# Altium footprint library IC.PCBLIB: 359 footprints (part 22 of 23)
Each footprint in its own frame and in the unit in brackets; x right, y up, seen from the top. Pads: shape width x height; smd on the part's side, far side on the other; paste and mask are expansions set on the pad; w line width, h text height; cw(c..) or ccw(c..) is an arc to the next point about the centre after c.
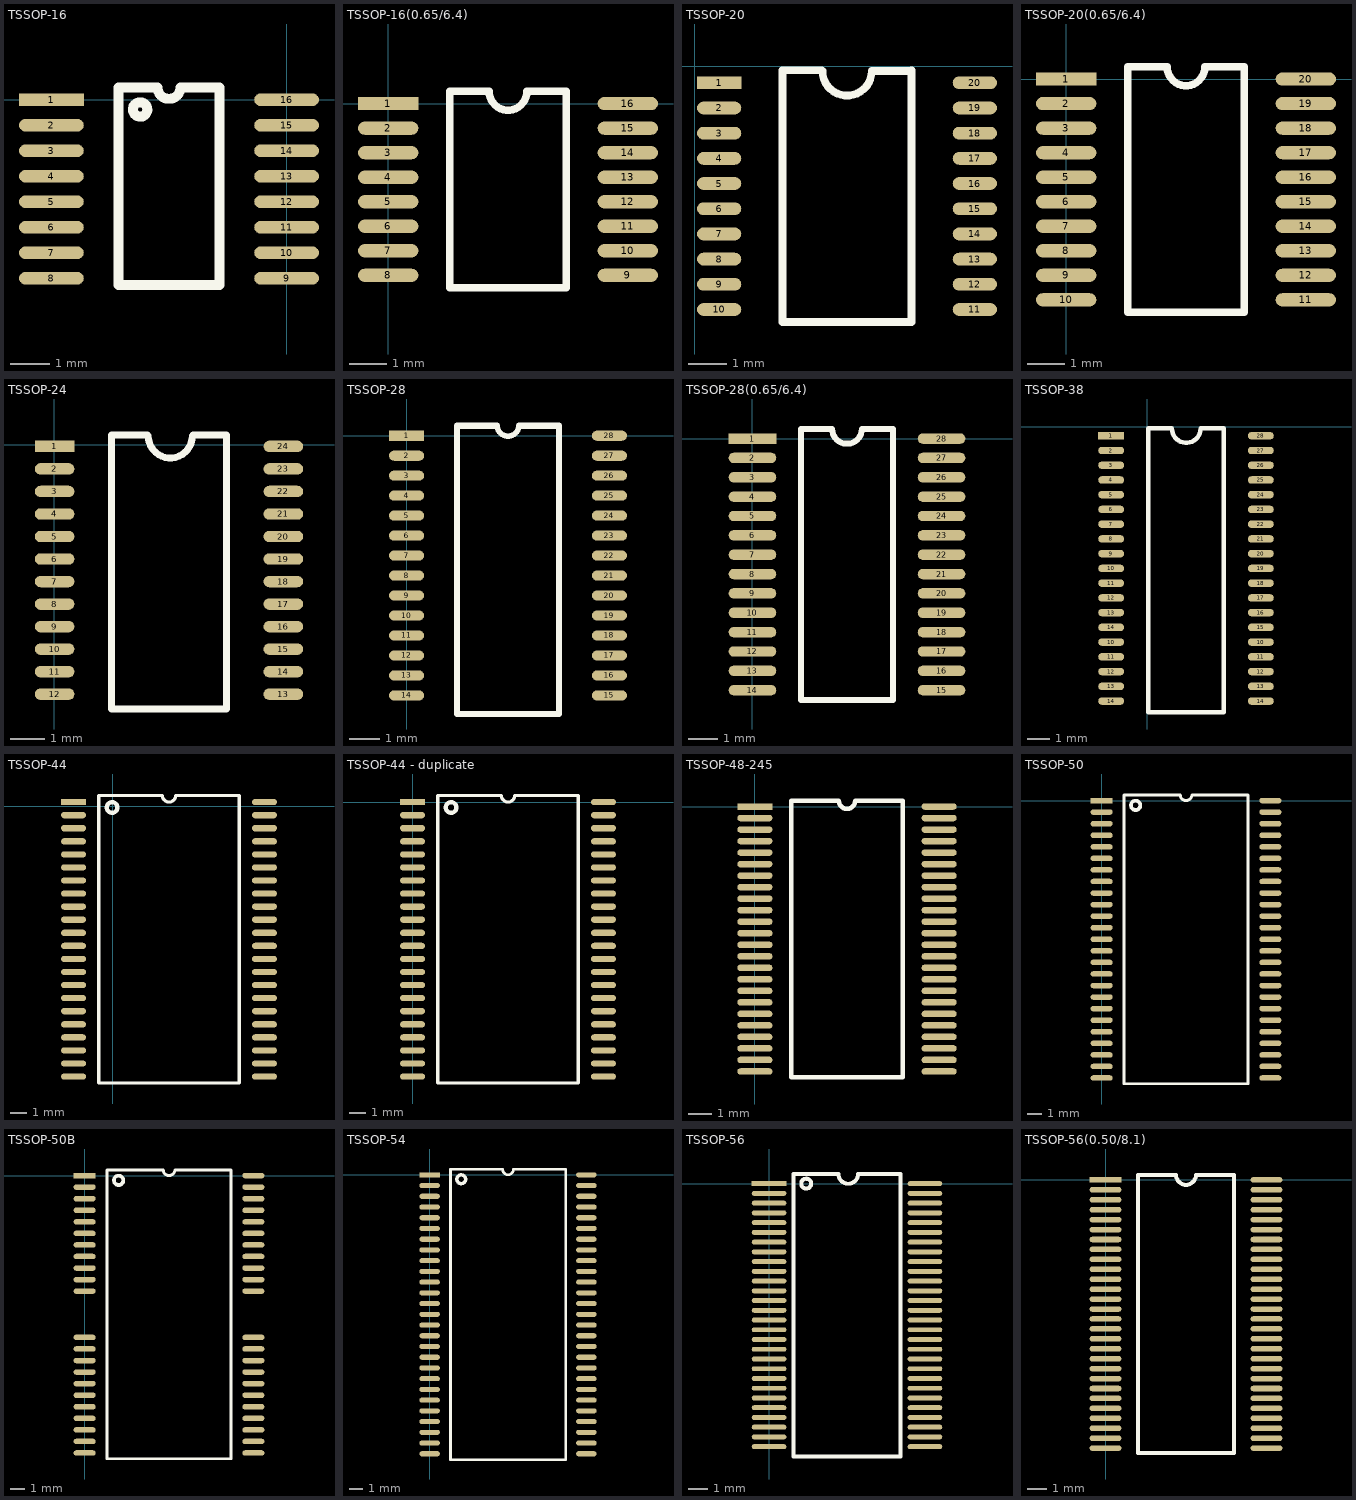
[diagram p21: the footprints below, top view; thin cyan lines are the x and y axes]

## TSSOP-16 [mil]
pads (16):
  rect 65x12.5 smd: 1(-236,0)
  oval 65x12.5 smd: 2(-236,-25.59) 3(-236,-51.18) 4(-236,-76.77) 5(-236,-102.36) 6(-236,-127.95) 7(-236,-153.54) 8(-236,-179.13) 9(0,-179.13) 10(0,-153.54) 11(0,-127.95) 12(0,-102.36) 13(0,-76.77) 14(0,-51.18) 15(0,-25.59) 16(0,0)
TopOverlay:
  lines w10: -147,-17 cw(c-147,-9.79) -145.98,-16.93 ; -168.5,-186 -67.5,-186 -67.5,12.5 -106.46,12.5 cw(c-118,12.5) -129.54,12.5 -168.5,12.5 -168.5,-186

## TSSOP-16(0.65/6.4) [mm]
pads (16):
  rect 1.6x0.35 smd: 1(0,0)
  oval 1.6x0.35 smd: 2(0,-0.65) 3(0,-1.3) 4(0,-1.95) 5(0,-2.6) 6(0,-3.25) 7(0,-3.9) 8(0,-4.55) 9(6.35,-4.55) 10(6.35,-3.9) 11(6.35,-3.25) 12(6.35,-2.6) 13(6.35,-1.95) 14(6.35,-1.3) 15(6.35,-0.65) 16(6.35,0)
TopOverlay:
  lines w0.2: 1.635,-4.875 1.635,0.325 2.675,0.325 ccw(c3.175,0.325) 3.675,0.325 4.715,0.325 4.715,-4.875 1.635,-4.875

## TSSOP-20 [mm]
pads (20):
  rect 1.143x0.33 smd: 1(0.635,-0.432)
  oval 1.143x0.33 smd: 2(0.635,-1.082) 3(0.635,-1.732) 4(0.635,-2.382) 5(0.635,-3.032) 6(0.635,-3.682) 7(0.635,-4.332) 8(0.635,-4.982) 9(0.635,-5.632) 10(0.635,-6.282) 11(7.235,-6.282) 12(7.235,-5.632) 13(7.235,-4.982) 14(7.235,-4.332) 15(7.235,-3.682) 16(7.235,-3.032) 17(7.235,-2.382) 18(7.235,-1.732) 19(7.235,-1.082) 20(7.235,-0.432)
TopOverlay:
  lines w0.2: 3.282,-0.107 2.27,-0.107 2.27,-6.607 5.6,-6.607 5.6,-0.107 ; 3.302,-0.127 ccw(c3.937,-0.127) 4.572,-0.127 5.58,-0.127

## TSSOP-20(0.65/6.4) [mm]
pads (20):
  rect 1.6x0.35 smd: 1(0,0)
  oval 1.6x0.35 smd: 2(0,-0.65) 3(0,-1.3) 4(0,-1.95) 5(0,-2.6) 6(0,-3.25) 7(0,-3.9) 8(0,-4.55) 9(0,-5.2) 10(0,-5.85) 11(6.35,-5.85) 12(6.35,-5.2) 13(6.35,-4.55) 14(6.35,-3.9) 15(6.35,-3.25) 16(6.35,-2.6) 17(6.35,-1.95) 18(6.35,-1.3) 19(6.35,-0.65) 20(6.35,0)
TopOverlay:
  lines w0.2: 1.635,-6.175 1.635,0.325 2.675,0.325 ccw(c3.175,0.325) 3.675,0.325 4.715,0.325 4.715,-6.175 1.635,-6.175

## TSSOP-24 [mm]
pads (24):
  rect 1.143x0.33 smd: 1(0.016,-0.046)
  oval 1.143x0.33 smd: 2(0.016,-0.696) 3(0.016,-1.346) 4(0.016,-1.996) 5(0.016,-2.646) 6(0.016,-3.296) 7(0.016,-3.946) 8(0.016,-4.596) 9(0.016,-5.246) 10(0.016,-5.896) 11(0.016,-6.546) 12(0.016,-7.196) 13(6.616,-7.196) 14(6.616,-6.546) 15(6.616,-5.896) 16(6.616,-5.246) 17(6.616,-4.596) 18(6.616,-3.946) 19(6.616,-3.296) 20(6.616,-2.646) 21(6.616,-1.996) 22(6.616,-1.346) 23(6.616,-0.696) 24(6.616,-0.046)
TopOverlay:
  lines w0.2: 2.692,0.279 1.651,0.279 1.651,-7.62 4.981,-7.62 4.981,0.279 4.013,0.279 ; 2.718,0.254 ccw(c3.353,0.254) 3.988,0.254

## TSSOP-28 [mm]
pads (28):
  rect 1.143x0.33 smd: 1(0,0)
  oval 1.143x0.33 smd: 2(0,-0.65) 3(0,-1.3) 4(0,-1.95) 5(0,-2.6) 6(0,-3.25) 7(0,-3.9) 8(0,-4.55) 9(0,-5.2) 10(0,-5.85) 11(0,-6.5) 12(0,-7.15) 13(0,-7.8) 14(0,-8.45) 15(6.6,-8.45) 16(6.6,-7.8) 17(6.6,-7.15) 18(6.6,-6.5) 19(6.6,-5.85) 20(6.6,-5.2) 21(6.6,-4.55) 22(6.6,-3.9) 23(6.6,-3.25) 24(6.6,-2.6) 25(6.6,-1.95) 26(6.6,-1.3) 27(6.6,-0.65) 28(6.6,0)
TopOverlay:
  lines w0.178: 2.941,0.347 ccw(c3.3,0.347) 3.659,0.347
  lines w0.2: 2.941,0.325 1.635,0.325 1.635,-9.054 4.965,-9.054 4.965,0.325 3.659,0.325

## TSSOP-28(0.65/6.4) [mm]
pads (28):
  rect 1.6x0.35 smd: 1(0,0)
  oval 1.6x0.35 smd: 2(0,-0.65) 3(0,-1.3) 4(0,-1.95) 5(0,-2.6) 6(0,-3.25) 7(0,-3.9) 8(0,-4.55) 9(0,-5.2) 10(0,-5.85) 11(0,-6.5) 12(0,-7.15) 13(0,-7.8) 14(0,-8.45) 15(6.35,-8.45) 16(6.35,-7.8) 17(6.35,-7.15) 18(6.35,-6.5) 19(6.35,-5.85) 20(6.35,-5.2) 21(6.35,-4.55) 22(6.35,-3.9) 23(6.35,-3.25) 24(6.35,-2.6) 25(6.35,-1.95) 26(6.35,-1.3) 27(6.35,-0.65) 28(6.35,0)
TopOverlay:
  lines w0.2: 1.635,-8.775 1.635,0.325 2.675,0.325 ccw(c3.175,0.325) 3.675,0.325 4.715,0.325 4.715,-8.775 1.635,-8.775

## TSSOP-38 [mm]
pads (38):
  rect 1.143x0.33 smd: 1(-1.584,-0.401)
  oval 1.143x0.33 smd: 2(-1.584,-1.051) 3(-1.584,-1.701) 4(-1.584,-2.351) 5(-1.584,-3.001) 6(-1.584,-3.651) 7(-1.584,-4.301) 8(-1.584,-4.951) 9(-1.584,-5.601) 10(-1.584,-9.501) 10(-1.584,-6.251) 10(5.016,-9.501) 11(-1.584,-10.151) 11(-1.584,-6.901) 11(5.016,-10.151) 12(-1.584,-10.801) 12(-1.584,-7.551) 12(5.016,-10.801) 13(-1.584,-11.451) 13(-1.584,-8.201) 13(5.016,-11.451) 14(-1.584,-12.101) 14(-1.584,-8.851) 14(5.016,-12.101) 15(5.016,-8.851) 16(5.016,-8.201) 17(5.016,-7.551) 18(5.016,-6.901) 19(5.016,-6.251) 20(5.016,-5.601) 21(5.016,-4.951) 22(5.016,-4.301) 23(5.016,-3.651) 24(5.016,-3.001) 25(5.016,-2.351) 26(5.016,-1.701) 27(5.016,-1.051) 28(5.016,-0.401)
TopOverlay:
  lines w0.2: 0.051,-12.6 3.381,-12.6 3.381,-0.076 2.362,-0.076 cw(c1.727,-0.076) 1.092,-0.076 0.051,-0.076 0.051,-12.6

## TSSOP-44 [mil]
pads (44):
  rect 60x15 smd: 1(-94,10)
  oval 60x15 smd: 2(-94,-21.5) 3(-94,-52.99) 4(-94,-84.49) 5(-94,-115.98) 6(-94,-147.48) 7(-94,-178.98) 8(-94,-210.47) 9(-94,-241.97) 10(-94,-273.46) 11(-94,-304.96) 12(-94,-336.46) 13(-94,-367.95) 14(-94,-399.45) 15(-94,-430.95) 16(-94,-462.44) 17(-94,-493.94) 18(-94,-525.43) 19(-94,-556.93) 20(-94,-588.43) 21(-94,-619.92) 22(-94,-651.42) 23(365.99,-651.42) 24(365.99,-619.92) 25(365.99,-588.43) 26(365.99,-556.93) 27(365.99,-525.43) 28(365.99,-493.94) 29(365.99,-462.44) 30(365.99,-430.95) 31(365.99,-399.45) 32(365.99,-367.95) 33(365.99,-336.46) 34(365.99,-304.96) 35(365.99,-273.46) 36(365.99,-241.97) 37(365.99,-210.47) 38(365.99,-178.98) 39(365.99,-147.48) 40(365.99,-115.98) 41(365.99,-84.49) 42(365.99,-52.99) 43(365.99,-21.5) 44(365.99,10)
TopOverlay:
  circle w10: c-1.21,-3 r12.81
  lines w7.87: -33,-667.17 -33,25.75 120.27,25.75 ccw(c136.09,25.75) 151.91,25.75 305.19,25.75 305.19,-667.17 -33,-667.17

## TSSOP-44 - duplicate [mil]
pads (44):
  rect 60x15 smd: 1(0,0)
  oval 60x15 smd: 2(0,-31.5) 3(0,-62.99) 4(0,-94.49) 5(0,-125.98) 6(0,-157.48) 7(0,-188.98) 8(0,-220.47) 9(0,-251.97) 10(0,-283.46) 11(0,-314.96) 12(0,-346.46) 13(0,-377.95) 14(0,-409.45) 15(0,-440.95) 16(0,-472.44) 17(0,-503.94) 18(0,-535.43) 19(0,-566.93) 20(0,-598.43) 21(0,-629.92) 22(0,-661.42) 23(459.99,-661.42) 24(459.99,-629.92) 25(459.99,-598.43) 26(459.99,-566.93) 27(459.99,-535.43) 28(459.99,-503.94) 29(459.99,-472.44) 30(459.99,-440.95) 31(459.99,-409.45) 32(459.99,-377.95) 33(459.99,-346.46) 34(459.99,-314.96) 35(459.99,-283.46) 36(459.99,-251.97) 37(459.99,-220.47) 38(459.99,-188.98) 39(459.99,-157.48) 40(459.99,-125.98) 41(459.99,-94.49) 42(459.99,-62.99) 43(459.99,-31.5) 44(459.99,0)
TopOverlay:
  circle w10: c92.79,-13 r12.81
  lines w7.87: 61,-677.17 61,15.75 214.27,15.75 ccw(c230.09,15.75) 245.91,15.75 399.19,15.75 399.19,-677.17 61,-677.17

## TSSOP-48-245 [mil]
pads (48):
  rect 60x11 smd: 1(0,0)
  oval 60x11 smd: 2(0,-19.68) 3(0,-39.37) 4(0,-59.06) 5(0,-78.74) 6(0,-98.42) 7(0,-118.11) 8(0,-137.79) 9(0,-157.48) 10(0,-177.16) 11(0,-196.85) 12(0,-216.53) 13(0,-236.22) 14(0,-255.91) 15(0,-275.59) 16(0,-295.27) 17(0,-314.96) 18(0,-334.64) 19(0,-354.33) 20(0,-374.01) 21(0,-393.7) 22(0,-413.38) 23(0,-433.07) 24(0,-452.76) 25(314.96,-452.75) 26(314.96,-433.07) 27(314.96,-413.38) 28(314.96,-393.7) 29(314.96,-374.01) 30(314.96,-354.33) 31(314.96,-334.64) 32(314.96,-314.96) 33(314.96,-295.27) 34(314.96,-275.59) 35(314.96,-255.91) 36(314.96,-236.22) 37(314.96,-216.53) 38(314.96,-196.85) 39(314.96,-177.16) 40(314.96,-157.48) 41(314.96,-137.79) 42(314.96,-118.11) 43(314.96,-98.42) 44(314.96,-78.74) 45(314.96,-59.05) 46(314.96,-39.37) 47(314.96,-19.68) 48(314.96,0)
TopOverlay:
  lines w7.87: 62.4,-462.6 62.4,9.84 143.63,9.84 ccw(c157.48,9.84) 171.33,9.84 252.56,9.84 252.56,-462.6 62.4,-462.6

## TSSOP-50 [mil]
pads (50):
  rect 60x15 smd: 1(0,0)
  oval 60x15 smd: 2(0,-31.5) 3(0,-62.99) 4(0,-94.49) 5(0,-125.98) 6(0,-157.48) 7(0,-188.98) 8(0,-220.47) 9(0,-251.97) 10(0,-283.46) 11(0,-314.96) 12(0,-346.46) 13(0,-377.95) 14(0,-409.45) 15(0,-440.95) 16(0,-472.44) 17(0,-503.94) 18(0,-535.43) 19(0,-566.93) 20(0,-598.43) 21(0,-629.92) 22(0,-661.42) 23(0,-692.91) 24(0,-724.41) 25(0,-755.91) 26(459.99,-755.91) 27(459.99,-724.41) 28(459.99,-692.91) 29(459.99,-661.42) 30(459.99,-629.92) 31(459.99,-598.43) 32(459.99,-566.93) 33(459.99,-535.43) 34(459.99,-503.94) 35(459.99,-472.44) 36(459.99,-440.95) 37(459.99,-409.45) 38(459.99,-377.95) 39(459.99,-346.46) 40(459.99,-314.96) 41(459.99,-283.46) 42(459.99,-251.97) 43(459.99,-220.47) 44(459.99,-188.98) 45(459.99,-157.48) 46(459.99,-125.98) 47(459.99,-94.49) 48(459.99,-62.99) 49(459.99,-31.5) 50(459.99,0)
TopOverlay:
  circle w10: c92.79,-13 r12.81
  lines w7.87: 61,-771.65 61,15.75 214.27,15.75 ccw(c230.09,15.75) 245.91,15.75 399.19,15.75 399.19,-771.65 61,-771.65

## TSSOP-50B [mil]
pads (44):
  rect 60x15 smd: 1(0,0)
  oval 60x15 smd: 2(0,-31.5) 3(0,-62.99) 4(0,-94.49) 5(0,-125.98) 6(0,-157.48) 7(0,-188.98) 8(0,-220.47) 9(0,-251.97) 10(0,-283.46) 11(0,-314.96) 15(0,-440.95) 16(0,-472.44) 17(0,-503.94) 18(0,-535.43) 19(0,-566.93) 20(0,-598.43) 21(0,-629.92) 22(0,-661.42) 23(0,-692.91) 24(0,-724.41) 25(0,-755.91) 26(459.99,-755.91) 27(459.99,-724.41) 28(459.99,-692.91) 29(459.99,-661.42) 30(459.99,-629.92) 31(459.99,-598.43) 32(459.99,-566.93) 33(459.99,-535.43) 34(459.99,-503.94) 35(459.99,-472.44) 36(459.99,-440.95) 40(459.99,-314.96) 41(459.99,-283.46) 42(459.99,-251.97) 43(459.99,-220.47) 44(459.99,-188.98) 45(459.99,-157.48) 46(459.99,-125.98) 47(459.99,-94.49) 48(459.99,-62.99) 49(459.99,-31.5) 50(459.99,0)
TopOverlay:
  circle w10: c92.79,-13 r12.81
  lines w7.87: 61,-771.65 61,15.75 214.27,15.75 ccw(c230.09,15.75) 245.91,15.75 399.19,15.75 399.19,-771.65 61,-771.65

## TSSOP-54 [mil]
pads (54):
  rect 60x15 smd: 1(0,0)
  oval 60x15 smd: 2(0,-31.5) 3(0,-62.99) 4(0,-94.49) 5(0,-125.98) 6(0,-157.48) 7(0,-188.98) 8(0,-220.47) 9(0,-251.97) 10(0,-283.46) 11(0,-314.96) 12(0,-346.46) 13(0,-377.95) 14(0,-409.45) 15(0,-440.95) 16(0,-472.44) 17(0,-503.94) 18(0,-535.43) 19(0,-566.93) 20(0,-598.43) 21(0,-629.92) 22(0,-661.42) 23(0,-692.91) 24(0,-724.41) 25(0,-755.91) 26(0,-787.4) 27(0,-818.9) 28(459.99,-818.9) 29(459.99,-787.4) 30(459.99,-755.91) 31(459.99,-724.41) 32(459.99,-692.91) 33(459.99,-661.42) 34(459.99,-629.92) 35(459.99,-598.43) 36(459.99,-566.93) 37(459.99,-535.43) 38(459.99,-503.94) 39(459.99,-472.44) 40(459.99,-440.95) 41(459.99,-409.45) 42(459.99,-377.95) 43(459.99,-346.46) 44(459.99,-314.96) 45(459.99,-283.46) 46(459.99,-251.97) 47(459.99,-220.47) 48(459.99,-188.98) 49(459.99,-157.48) 50(459.99,-125.98) 51(459.99,-94.49) 52(459.99,-62.99) 53(459.99,-31.5) 54(459.99,0)
TopOverlay:
  circle w10: c92.79,-13 r12.81
  lines w7.87: 61,-836 61,16 214.27,16 ccw(c230.09,16) 245.91,16 400,16 400,-836 61,-836

## TSSOP-56 [mil]
pads (56):
  rect 70x10 smd: 1(0,0)
  oval 70x10 smd: 2(0,-19.69) 3(0,-39.37) 4(0,-59.06) 5(0,-78.74) 6(0,-98.43) 7(0,-118.11) 8(0,-137.8) 9(0,-157.48) 10(0,-177.17) 11(0,-196.85) 12(0,-216.54) 13(0,-236.22) 14(0,-255.91) 15(0,-275.59) 16(0,-295.28) 17(0,-314.96) 18(0,-334.65) 19(0,-354.33) 20(0,-374.02) 21(0,-393.7) 22(0,-413.39) 23(0,-433.07) 24(0,-452.76) 25(0,-472.44) 26(0,-492.13) 27(0,-511.81) 28(0,-531.5) 29(314.96,-531.5) 30(314.96,-511.81) 31(314.96,-492.13) 32(314.96,-472.44) 33(314.96,-452.76) 34(314.96,-433.07) 35(314.96,-413.39) 36(314.96,-393.7) 37(314.96,-374.02) 38(314.96,-354.33) 39(314.96,-334.65) 40(314.96,-314.96) 41(314.96,-295.28) 42(314.96,-275.59) 43(314.96,-255.91) 44(314.96,-236.22) 45(314.96,-216.54) 46(314.96,-196.85) 47(314.96,-177.17) 48(314.96,-157.48) 49(314.96,-137.8) 50(314.96,-118.11) 51(314.96,-98.43) 52(314.96,-78.74) 53(314.96,-59.06) 54(314.96,-39.37) 55(314.96,-19.69) 56(314.96,0)
TopOverlay:
  circle w8: c75,0 r10
  lines w8: 49.21,-551.18 49.21,19.68 140,19.68 ccw(c160,19.68) 180,19.68 265.75,19.68 265.75,-551.18 49.21,-551.18

## TSSOP-56(0.50/8.1) [mm]
pads (56):
  rect 1.6x0.28 smd: 1(0,0)
  oval 1.6x0.28 smd: 2(0,-0.5) 3(0,-1) 4(0,-1.5) 5(0,-2) 6(0,-2.5) 7(0,-3) 8(0,-3.5) 9(0,-4) 10(0,-4.5) 11(0,-5) 12(0,-5.5) 13(0,-6) 14(0,-6.5) 15(0,-7) 16(0,-7.5) 17(0,-8) 18(0,-8.5) 19(0,-9) 20(0,-9.5) 21(0,-10) 22(0,-10.5) 23(0,-11) 24(0,-11.5) 25(0,-12) 26(0,-12.5) 27(0,-13) 28(0,-13.5) 29(8.1,-13.5) 30(8.1,-13) 31(8.1,-12.5) 32(8.1,-12) 33(8.1,-11.5) 34(8.1,-11) 35(8.1,-10.5) 36(8.1,-10) 37(8.1,-9.5) 38(8.1,-9) 39(8.1,-8.5) 40(8.1,-8) 41(8.1,-7.5) 42(8.1,-7) 43(8.1,-6.5) 44(8.1,-6) 45(8.1,-5.5) 46(8.1,-5) 47(8.1,-4.5) 48(8.1,-4) 49(8.1,-3.5) 50(8.1,-3) 51(8.1,-2.5) 52(8.1,-2) 53(8.1,-1.5) 54(8.1,-1) 55(8.1,-0.5) 56(8.1,0)
TopOverlay:
  lines w0.2: 1.635,-13.75 1.635,0.25 3.55,0.25 ccw(c4.05,0.25) 4.55,0.25 6.465,0.25 6.465,-13.75 1.635,-13.75